# Altium footprint library ICL_komponenty_v1.PcbLib: 160 footprints (part 10 of 10)
Each footprint in its own frame and in the unit in brackets; x right, y up, seen from the top. Pads: shape width x height; smd on the part's side, far side on the other; paste and mask are expansions set on the pad; w line width, h text height; cw(c..) or ccw(c..) is an arc to the next point about the centre after c.
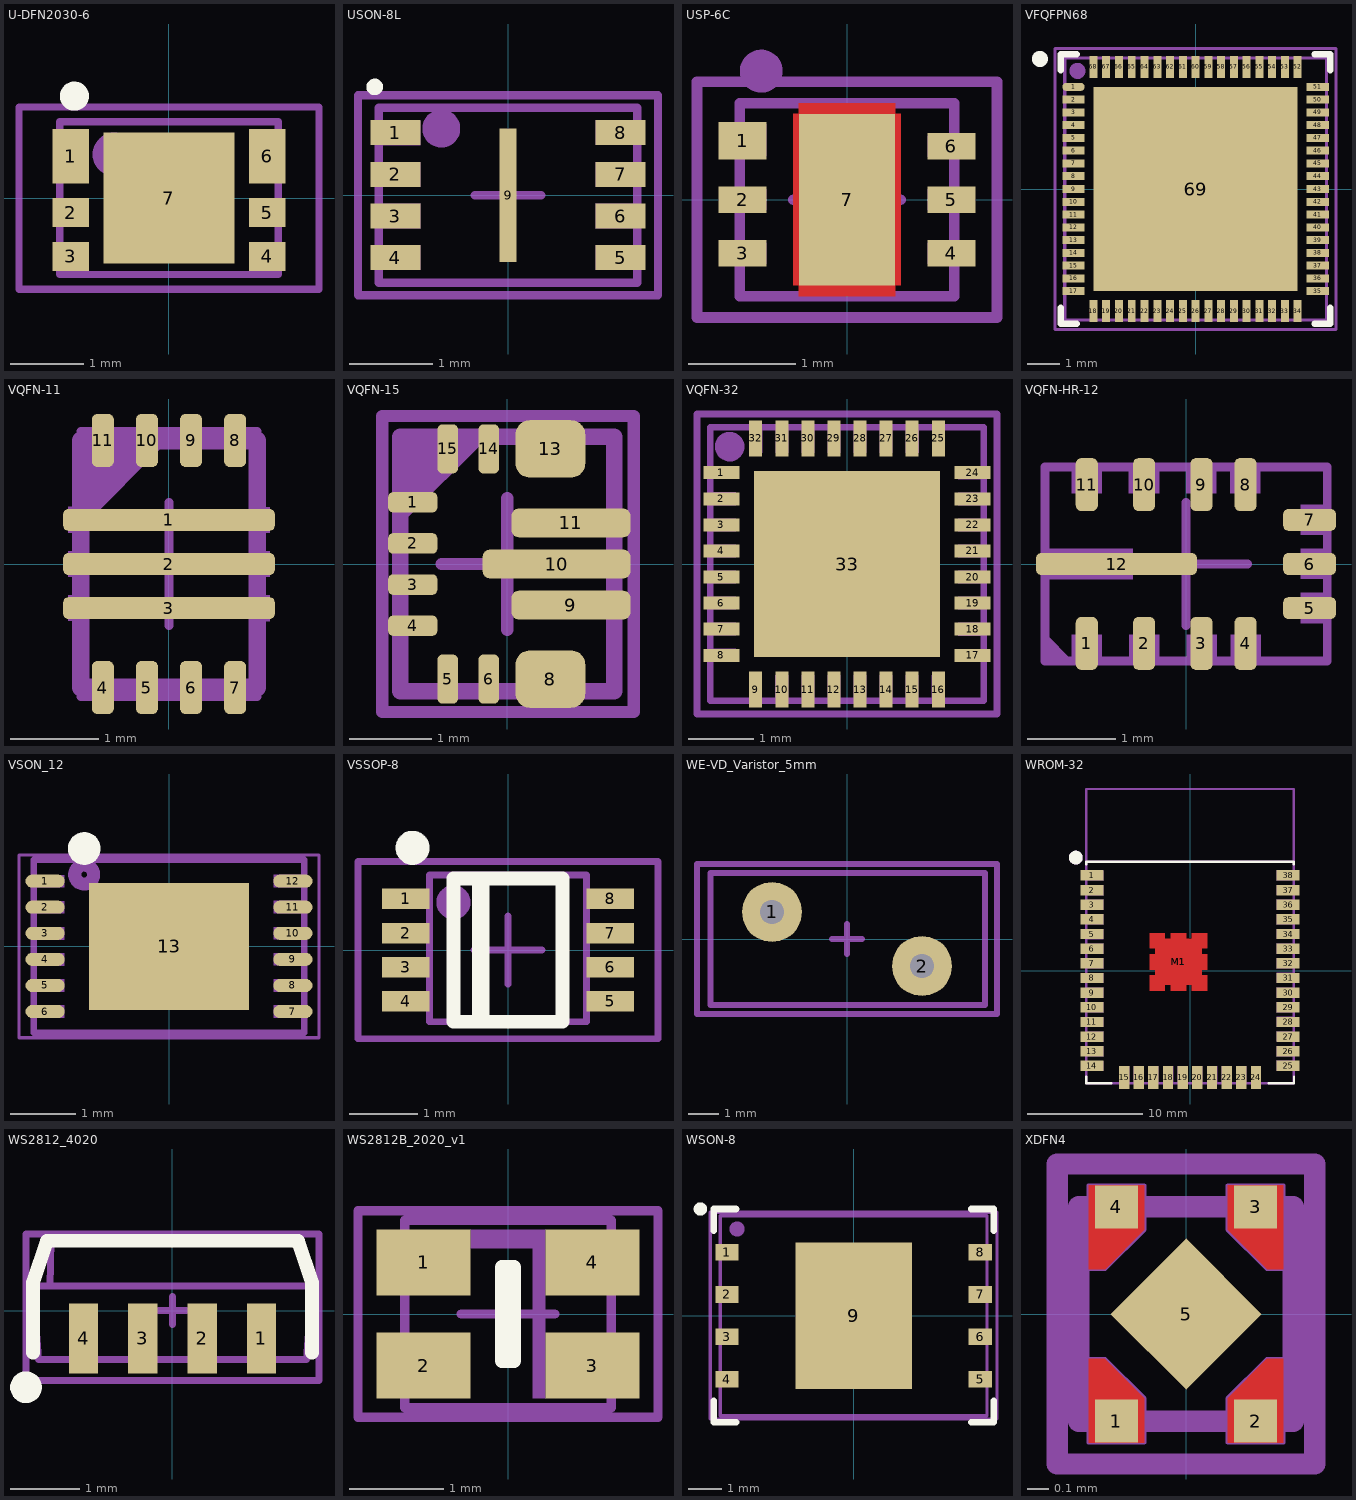
[diagram p9: the footprints below, top view; thin cyan lines are the x and y axes]

## U-DFN2030-6 [mm] "DIODEC modyfied DFN-6"
height 0.6
pads (7):
  rect 0.5x0.75 smd: 1(-1.35,0.575) 6(1.35,0.575)
  rect 0.5x0.4 smd: 2(-1.35,-0.2) 3(-1.35,-0.8) 4(1.35,-0.8) 5(1.35,-0.2)
  rect 1.8x1.8 smd: 7(0,0)
Top Overlay:
  circle w0.2: c-1.3,1.4 r0.1
Top M11-12_SMOT:
  circle w0.3: c-0.75,0.6 r0.15
  rectangle: -1.5,0.25 -1.2,0.9
  rectangle: -1.5,-0.35 -1.2,-0.05
  rectangle: -1.5,-0.95 -1.2,-0.65
  rectangle: 1.2,-0.95 1.5,-0.65
  rectangle: 1.2,-0.35 1.5,-0.05
  rectangle: 1.2,0.25 1.5,0.9
  lines w0.1: -1.5,-1.05 1.5,-1.05 1.5,1.05 -1.5,1.05 -1.5,-1.05
Top M13-14_SDES:
  text "'.Designator'" at 0.2,-3.399 h0.6
Top M15-16_SORG:
  lines w0.1: -0.5,0 0.5,0 ; 0,-0.5 0,0.5 ; -2.06,-1.25 -2.06,1.25 2.06,1.25 2.06,-1.25 -2.06,-1.25
3D body "U-DFN2030-6.step": height 0.6, standoff 0, extent -1.51,-1.075 1.51,1.075

## USON-8L [mm] "3x2mm APMEMORY"
height 0.5
pads (9):
  rect 0.6x0.3 smd paste-0.05: 1(-1.35,0.75) 2(-1.35,0.25) 3(-1.35,-0.25) 4(-1.35,-0.75) 5(1.35,-0.75) 6(1.35,-0.25) 7(1.35,0.25) 8(1.35,0.75)
  rect 0.2x1.6 smd paste-0.1: 9(0,0)
Top Overlay:
  circle w0.1: c-1.6,1.3 r0.05
Top Paste:
  rectangle: -0.1,-0.8 0.1,-0.6
  rectangle: -0.1,-0.4 0.1,-0.1
  rectangle: -0.1,0.1 0.1,0.4
  rectangle: -0.1,0.6 0.1,0.8
Top M11-12_SMOT:
  circle w0.254: c-0.8,0.8 r0.1
  region: 1.55,0.9 1.05,0.9 1.05,0.6 1.55,0.6
  region: 1.55,-0.6 1.05,-0.6 1.05,-0.9 1.55,-0.9
  region: 1.55,0.4 1.05,0.4 1.05,0.1 1.55,0.1
  region: 1.55,-0.1 1.05,-0.1 1.05,-0.4 1.55,-0.4
  rectangle: -1.55,-0.9 -1.05,-0.6
  rectangle: -1.55,0.6 -1.05,0.9
  rectangle: -1.55,-0.4 -1.05,-0.1
  rectangle: -1.55,0.1 -1.05,0.4
  lines w0.1: -1.55,-1.05 -1.55,1.05 1.55,1.05 1.55,-1.05 -1.55,-1.05
Top M13-14_SDES:
  text "'.Designator'" at -2.266,1.333 h0.4
Top M15-16_SORG:
  lines w0.1: -0.4,0 0,0 ; 0,-0.4 0,0 ; 0,0.4 0,0 ; 0.4,0 0,0 ; -1.8,-1.2 -1.8,1.2 1.8,1.2 1.8,-1.2 -1.8,-1.2
3D body "USON-8L.step": height 0.5, standoff 0, extent -1.551,-1.05 1.551,1.05

## USP-6C [mm] "Torex"
pads (7):
  rect 0.45x0.35 smd paste-0.3: 1(-0.975,0.55)
  rect 0.45x0.25 smd paste-0.3: 2(-0.975,0) 3(-0.975,-0.5) 4(0.975,-0.5) 5(0.975,0) 6(0.975,0.5)
  rect 0.9x1.6 smd paste-0.9: 7(0,0)
Top Layer:
  region: -0.5,-0.8 -0.5,0.8 -0.45,0.8 -0.45,0.9 0.45,0.9 0.45,0.8 0.5,0.8 0.5,-0.8 0.45,-0.8 0.45,-0.9 -0.45,-0.9 -0.45,-0.8
Top Paste:
  region: -0.4,0.3 -0.4,0.6 -0.25,0.6 -0.25,0.7 0.25,0.7 0.25,0.6 0.4,0.6 0.4,0.3
  region: -0.4,-0.6 -0.25,-0.6 -0.25,-0.7 0.25,-0.7 0.25,-0.6 0.4,-0.6 0.4,-0.3 -0.4,-0.3
  region: -1.15,0.375 -1.15,0.725 -0.8,0.725 -0.8,0.375
  region: -1.15,-0.125 -1.15,0.125 -0.8,0.125 -0.8,-0.125
  region: -1.15,-0.625 -0.8,-0.625 -0.8,-0.375 -1.15,-0.375
  region: 0.8,0.375 1.15,0.375 1.15,0.625 0.8,0.625
  region: 0.8,-0.125 0.8,0.125 1.15,0.125 1.15,-0.125
  region: 0.8,-0.625 0.8,-0.375 1.15,-0.375 1.15,-0.625
Top M11-12_SMOT:
  circle w0.2: c-0.8,1.2 r0.1
  rectangle: -1,-0.101 -0.75,0.099
  rectangle: -1,-0.601 -0.75,-0.401
  region: 1,-0.399 0.75,-0.399 0.75,-0.599 1,-0.599
  region: 1,0.101 0.75,0.101 0.75,-0.099 1,-0.099
  region: 1,0.601 0.75,0.601 0.75,0.401 1,0.401
  rectangle: -1,0.405 -0.75,0.705
  rectangle: -0.4,-0.7 0.4,0.7
  lines w0.1: -1,-0.9 1,-0.9 1,0.9 -1,0.9 -1,-0.9
Top M13-14_SDES:
  text "'.Designator'" at 0.25,-3.399 h0.6
Top M15-16_SORG:
  lines w0.1: -0.5,0 0,0 ; 0,-0.5 0,0 ; 0,0.5 0,0 ; 0.5,0 0,0 ; -1.4,-1.1 1.4,-1.1 1.4,1.1 -1.4,1.1 -1.4,-1.1
3D body: height 0.61, standoff 0.6, extent -0.9,0.4 -0.5,0.8
3D body: height 0.6, standoff 0, extent -1,-0.9 1,0.9

## VFQFPN68 [mm] "STM QFN 68 E 0.4MM"
height 1
pads (69):
  oval 0.7x0.25 smd: 1(-3.825,3.2)
  rect 0.7x0.25 smd: 2(-3.825,2.8) 3(-3.825,2.4) 4(-3.825,2) 5(-3.825,1.6) 6(-3.825,1.2) 7(-3.825,0.8) 8(-3.825,0.4) 9(-3.825,0) 10(-3.825,-0.4) 11(-3.825,-0.8) 12(-3.825,-1.2) 13(-3.825,-1.6) 14(-3.825,-2) 15(-3.825,-2.4) 16(-3.825,-2.8) 17(-3.825,-3.2) 35(3.825,-3.2) 36(3.825,-2.8) 37(3.825,-2.4) 38(3.825,-2) 39(3.825,-1.6) 40(3.825,-1.2) 41(3.825,-0.8) 42(3.825,-0.4) 43(3.825,0) 44(3.825,0.4) 45(3.825,0.8) 46(3.825,1.2) 47(3.825,1.6) 48(3.825,2) 49(3.825,2.4) 50(3.825,2.8) 51(3.825,3.2)
  rect 0.25x0.7 smd: 18(-3.2,-3.825) 19(-2.8,-3.825) 20(-2.4,-3.825) 21(-2,-3.825) 22(-1.6,-3.825) 23(-1.2,-3.825) 24(-0.8,-3.825) 25(-0.4,-3.825) 26(0,-3.825) 27(0.4,-3.825) 28(0.8,-3.825) 29(1.2,-3.825) 30(1.6,-3.825) 31(2,-3.825) 32(2.4,-3.825) 33(2.8,-3.825) 34(3.2,-3.825) 52(3.2,3.825) 53(2.8,3.825) 54(2.4,3.825) 55(2,3.825) 56(1.6,3.825) 57(1.2,3.825) 58(0.8,3.825) 59(0.4,3.825) 60(0,3.825) 61(-0.4,3.825) 62(-0.8,3.825) 63(-1.2,3.825) 64(-1.6,3.825) 65(-2,3.825) 66(-2.4,3.825) 67(-2.8,3.825) 68(-3.2,3.825)
  rect 6.4x6.4 smd: 69(0,0)
Top Overlay:
  circle w0.25: c-4.875,4.075 r0.125
  lines w0.2: -4.225,-3.725 -4.225,-4.225 -3.725,-4.225 ; -4.225,3.725 -4.225,4.225 -3.725,4.225 ; 3.725,-4.225 4.225,-4.225 4.225,-3.725 ; 3.725,4.225 4.225,4.225 4.225,3.725
Top M11-12_SMOT:
  circle w0.25: c-3.7,3.7 r0.125
  region: -3.3,4.1 -3.3,3.6 -3.1,3.6 -3.1,4.1
  region: -2.9,4.1 -2.9,3.6 -2.7,3.6 -2.7,4.1
  region: -2.5,4.1 -2.5,3.6 -2.3,3.6 -2.3,4.1
  region: -2.1,4.1 -2.1,3.6 -1.9,3.6 -1.9,4.1
  region: -1.7,4.1 -1.7,3.6 -1.5,3.6 -1.5,4.1
  region: -1.3,4.1 -1.3,3.6 -1.1,3.6 -1.1,4.1
  region: -0.9,4.1 -0.9,3.6 -0.7,3.6 -0.7,4.1
  region: -0.5,4.1 -0.5,3.6 -0.3,3.6 -0.3,4.1
  region: -0.1,4.1 -0.1,3.6 0.1,3.6 0.1,4.1
  region: 0.3,4.1 0.3,3.6 0.5,3.6 0.5,4.1
  region: 0.7,4.1 0.7,3.6 0.9,3.6 0.9,4.1
  region: 1.1,4.1 1.1,3.6 1.3,3.6 1.3,4.1
  region: 1.5,4.1 1.5,3.6 1.7,3.6 1.7,4.1
  region: 1.9,4.1 1.9,3.6 2.1,3.6 2.1,4.1
  region: 2.3,4.1 2.3,3.6 2.5,3.6 2.5,4.1
  region: 2.7,4.1 2.7,3.6 2.9,3.6 2.9,4.1
  region: 3.1,4.1 3.1,3.6 3.3,3.6 3.3,4.1
  region: 4.1,3.3 3.6,3.3 3.6,3.1 4.1,3.1
  region: 4.1,2.9 3.6,2.9 3.6,2.7 4.1,2.7
  region: 4.1,2.5 3.6,2.5 3.6,2.3 4.1,2.3
  region: 4.1,2.1 3.6,2.1 3.6,1.9 4.1,1.9
  region: 4.1,1.7 3.6,1.7 3.6,1.5 4.1,1.5
  region: 4.1,1.3 3.6,1.3 3.6,1.1 4.1,1.1
  region: 4.1,0.9 3.6,0.9 3.6,0.7 4.1,0.7
  region: 4.1,0.5 3.6,0.5 3.6,0.3 4.1,0.3
  region: 4.1,0.1 3.6,0.1 3.6,-0.1 4.1,-0.1
  region: 4.1,-0.3 3.6,-0.3 3.6,-0.5 4.1,-0.5
  region: 4.1,-0.7 3.6,-0.7 3.6,-0.9 4.1,-0.9
  region: 4.1,-1.1 3.6,-1.1 3.6,-1.3 4.1,-1.3
  region: 4.1,-1.5 3.6,-1.5 3.6,-1.7 4.1,-1.7
  region: 4.1,-1.9 3.6,-1.9 3.6,-2.1 4.1,-2.1
  region: 4.1,-2.3 3.6,-2.3 3.6,-2.5 4.1,-2.5
  region: 4.1,-2.7 3.6,-2.7 3.6,-2.9 4.1,-2.9
  region: 4.1,-3.1 3.6,-3.1 3.6,-3.3 4.1,-3.3
  region: 3.3,-4.1 3.3,-3.6 3.1,-3.6 3.1,-4.1
  region: 2.9,-4.1 2.9,-3.6 2.7,-3.6 2.7,-4.1
  region: 2.5,-4.1 2.5,-3.6 2.3,-3.6 2.3,-4.1
  region: 2.1,-4.1 2.1,-3.6 1.9,-3.6 1.9,-4.1
  region: 1.7,-4.1 1.7,-3.6 1.5,-3.6 1.5,-4.1
  region: 1.3,-4.1 1.3,-3.6 1.1,-3.6 1.1,-4.1
  region: 0.9,-4.1 0.9,-3.6 0.7,-3.6 0.7,-4.1
  region: 0.5,-4.1 0.5,-3.6 0.3,-3.6 0.3,-4.1
  region: 0.1,-4.1 0.1,-3.6 -0.1,-3.6 -0.1,-4.1
  region: -0.3,-4.1 -0.3,-3.6 -0.5,-3.6 -0.5,-4.1
  region: -0.7,-4.1 -0.7,-3.6 -0.9,-3.6 -0.9,-4.1
  region: -1.1,-4.1 -1.1,-3.6 -1.3,-3.6 -1.3,-4.1
  region: -1.5,-4.1 -1.5,-3.6 -1.7,-3.6 -1.7,-4.1
  region: -1.9,-4.1 -1.9,-3.6 -2.1,-3.6 -2.1,-4.1
  region: -2.3,-4.1 -2.3,-3.6 -2.5,-3.6 -2.5,-4.1
  region: -2.7,-4.1 -2.7,-3.6 -2.9,-3.6 -2.9,-4.1
  region: -3.1,-4.1 -3.1,-3.6 -3.3,-3.6 -3.3,-4.1
  rectangle: -4.1,-3.3 -3.6,-3.1
  rectangle: -4.1,-2.9 -3.6,-2.7
  rectangle: -4.1,-2.5 -3.6,-2.3
  rectangle: -4.1,-2.1 -3.6,-1.9
  rectangle: -4.1,-1.7 -3.6,-1.5
  rectangle: -4.1,-1.3 -3.6,-1.1
  rectangle: -4.1,-0.9 -3.6,-0.7
  rectangle: -4.1,-0.5 -3.6,-0.3
  rectangle: -4.1,-0.1 -3.6,0.1
  rectangle: -4.1,0.3 -3.6,0.5
  rectangle: -4.1,0.7 -3.6,0.9
  rectangle: -4.1,1.1 -3.6,1.3
  rectangle: -4.1,1.5 -3.6,1.7
  rectangle: -4.1,1.9 -3.6,2.1
  rectangle: -4.1,2.3 -3.6,2.5
  rectangle: -4.1,2.7 -3.6,2.9
  rectangle: -4.1,3.1 -3.6,3.3
  lines w0.1: -4.1,-4.1 -4.1,4.1 4.1,4.1 4.1,-4.1 -4.1,-4.1
Top M13-14_SDES:
  text "'.Designator'" at -4.932,4.767 h0.8
Top M15-16_SORG:
  lines w0.1: -1,0 0,0 ; 0,-1 0,0 ; 0,1 0,0 ; 1,0 0,0 ; -4.4,-4.4 -4.4,4.4 4.4,4.4 4.4,-4.4 -4.4,-4.4
3D body "VFQFPN68.step": height 1, standoff 0, extent -4.085,-4.085 4.085,4.085

## VQFN-11 [mm] "3-V to 17-V 4-A Step-Down Converters"
pads (11):
  rrect50% 2.4x0.25 smd paste-0.25 mask+0.05: 1(0,0.5) 2(0,0) 3(0,-0.5)
  rrect50% 0.25x0.6 smd paste+0 mask+0.05: 4(-0.75,-1.4) 5(-0.25,-1.4) 6(0.25,-1.4) 7(0.75,-1.4) 8(0.75,1.4) 9(0.25,1.4) 10(-0.25,1.4) 11(-0.75,1.4)
Top Paste:
  drawing of 9 lines, arcs and shapes, not listed
Top M11-12_SMOT:
  region: 1.052,0.148 1.052,-0.15 1.145,-0.15 1.145,0.148
  region: -1.052,-0.148 -1.052,0.15 -1.145,0.15 -1.145,-0.148
  rectangle: 0.602,1.452 0.9,1.545
  rectangle: 0.102,1.452 0.4,1.545
  region: 1.052,0.648 1.052,0.35 1.145,0.35 1.145,0.648
  region: 0.898,-1.452 0.6,-1.452 0.6,-1.545 0.898,-1.545
  region: 0.398,-1.452 0.1,-1.452 0.1,-1.545 0.398,-1.545
  region: 1.052,-0.352 1.052,-0.65 1.145,-0.65 1.145,-0.352
  rectangle: -0.398,1.452 -0.1,1.545
  rectangle: -0.898,1.452 -0.6,1.545
  region: -1.052,0.352 -1.052,0.65 -1.145,0.65 -1.145,0.352
  region: -0.102,-1.452 -0.4,-1.452 -0.4,-1.545 -0.102,-1.545
  region: -0.602,-1.452 -0.9,-1.452 -0.9,-1.545 -0.602,-1.545
  region: -1.052,-0.648 -1.052,-0.35 -1.145,-0.35 -1.145,-0.648
  region: -1.044,1.428 0.028,1.428 -1.028,0.372 -1.028,0.369
  lines w0.2: -1,-1.4 1,-1.4 1,1.4 -1,1.4 -1,-1.4
Top M13-14_SDES:
  text "'.Designator'" at -0.231,2.818 h0.5
Top M15-16_SORG:
  lines w0.1: -0.7,0 0,0 ; 0,-0.7 0,0 ; 0,0.7 0,0 ; 0.7,0 0,0 ; -1,-1.5 -1,1.5 1,1.5 1,-1.5 -1,-1.5
3D body: height 0.2, standoff 0, extent 1,-0.1 1.014,0.1
3D body: height 0.2, standoff 0, extent -1.014,-0.1 -1,0.1
3D body: height 0.2, standoff 0, extent 0.154,1.496 0.354,1.51
3D body: height 0.2, standoff 0, extent 0.654,1.496 0.854,1.51
3D body: height 0.2, standoff 0, extent 1,0.4 1.014,0.6
3D body: height 0.2, standoff 0, extent 0.146,-1.51 0.346,-1.496
3D body: height 0.2, standoff 0, extent 0.646,-1.51 0.846,-1.496
3D body: height 0.2, standoff 0, extent 1,-0.6 1.014,-0.4
3D body: height 0.2, standoff 0, extent -0.846,1.496 -0.646,1.51
3D body: height 0.2, standoff 0, extent -0.346,1.496 -0.146,1.51
3D body: height 0.2, standoff 0, extent -1.014,0.4 -1,0.6
3D body: height 0.2, standoff 0, extent -0.854,-1.51 -0.654,-1.496
3D body: height 0.2, standoff 0, extent -0.354,-1.51 -0.154,-1.496
3D body: height 0.2, standoff 0, extent -1.014,-0.6 -1,-0.4
3D body: height 1.01, standoff 1, extent -0.842,0.919 -0.443,1.318
3D body: height 1, standoff 0, extent -1,-1.5 1,1.5

## VQFN-15 [mm] "TI VQFN power package"
pads (13):
  rrect50% 0.6x0.25 smd mask+0.05: 1(-1.15,0.75) 2(-1.15,0.25) 3(-1.15,-0.25) 4(-1.15,-0.75)
  rrect50% 0.25x0.6 smd mask+0.05: 5(-0.725,-1.4) 6(-0.225,-1.4) 14(-0.225,1.4) 15(-0.725,1.4)
  rrect50% 0.85x0.7 smd paste-0.45 mask-0.5: 8(0.525,-1.4) 13(0.525,1.4)
  rrect50% 1.45x0.35 smd paste-0.175 mask-0.05: 9(0.775,-0.5) 11(0.775,0.5)
  rrect50% 1.8x0.35 smd paste-0.175 mask-0.05: 10(0.6,0)
Top Paste:
  drawing of 8 lines, arcs and shapes, not listed
Top Solder:
  region: 0.9,-1.235 0.9,-1.6 0.9,-1.62 0.885,-1.657 0.857,-1.685 0.82,-1.7 0.8,-1.7 0.75,-1.7 0.73,-1.7 0.693,-1.685 0.665,-1.657 0.65,-1.62 0.65,-1.6 0.65,-1.35 0.4,-1.35 0.4,-1.6 0.4,-1.62 0.385,-1.657 0.357,-1.685 0.32,-1.7 0.3,-1.7 0.25,-1.7 0.23,-1.7 0.193,-1.685 0.165,-1.657 0.15,-1.62 0.15,-1.6 0.15,-1.25 0.15,-1.22 0.173,-1.165 0.215,-1.123 0.27,-1.1 0.3,-1.1 0.765,-1.1 0.792,-1.1 0.841,-1.121 0.879,-1.159 0.9,-1.208
  region: 0.15,1.25 0.15,1.6 0.15,1.62 0.165,1.657 0.193,1.685 0.23,1.7 0.25,1.7 0.3,1.7 0.32,1.7 0.357,1.685 0.385,1.657 0.4,1.62 0.4,1.6 0.4,1.35 0.65,1.35 0.65,1.6 0.65,1.62 0.665,1.657 0.693,1.685 0.73,1.7 0.75,1.7 0.8,1.7 0.82,1.7 0.857,1.685 0.885,1.657 0.9,1.62 0.9,1.6 0.9,1.25 0.9,1.22 0.877,1.165 0.835,1.123 0.78,1.1 0.75,1.1 0.3,1.1 0.27,1.1 0.215,1.123 0.173,1.165 0.15,1.22
Top M11-12_SMOT:
  region: -1.3,1.55 -0.228,1.55 -1.284,0.494 -1.284,0.491
  lines w0.05: 1.3,-1.55 ccw(c1.3,-1.55) 1.3,-1.55 ; 1.3,-1.55 ccw(c1.3,-1.55) 1.3,-1.55
  lines w0.2: -1.3,-1.55 -1.3,-1.55 ; -1.3,-1.55 -1.3,1.55 1.3,1.55 1.3,-1.55 -1.3,-1.55
Top M13-14_SDES:
  text "'.Designator'" at -5.665,-0.417 h1
Top M15-16_SORG:
  lines w0.15: -0.8,0 0,0 ; 0,-0.8 0,0 ; 0,0.8 0,0 ; 0.8,0 0,0 ; -1.523,-1.8 1.541,-1.8 1.541,1.8 -1.523,1.8 -1.523,-1.8
3D body: height 0.2, standoff 0, extent -0.334,-1.564 -0.116,-1.511
3D body: height 0.2, standoff 0, extent -0.834,-1.564 -0.616,-1.511
3D body: height 0.2, standoff 0, extent -1.314,-0.859 -1.261,-0.641
3D body: height 0.2, standoff 0, extent -1.314,-0.359 -1.261,-0.141
3D body: height 1.05, standoff 1, extent -1.149,0.751 -0.451,1.449
3D body: height 0.2, standoff 0, extent -1.314,0.141 -1.261,0.359
3D body: height 0.2, standoff 0, extent -1.314,0.641 -1.261,0.859
3D body: height 0.2, standoff 0, extent -0.834,1.511 -0.616,1.564
3D body: height 0.2, standoff 0, extent -0.334,1.511 -0.116,1.564
3D body: height 0.2, standoff 0, extent 1.211,-0.636 1.315,-0.361
3D body: height 0.2, standoff 0, extent 0.141,-1.564 0.416,-1.461
3D body: height 0.2, standoff 0, extent 0.641,-1.565 0.916,-1.461
3D body: height 0.2, standoff 0, extent 1.211,0.364 1.315,0.639
3D body: height 0.2, standoff 0, extent 0.634,1.461 0.91,1.564
3D body: height 0.2, standoff 0, extent 0.134,1.461 0.409,1.565
3D body: height 0.2, standoff 0, extent 1.206,-0.135 1.309,0.14
3D body: height 1, standoff 0, extent -1.3,-1.55 1.3,1.55

## VQFN-32 [mm] "TI VQFN 4X4 32 pin"
pads (33):
  rect 0.55x0.2 smd paste+0 mask+0: 1(-1.925,1.4) 2(-1.925,1) 3(-1.925,0.6) 4(-1.925,0.2) 5(-1.925,-0.2) 6(-1.925,-0.6) 7(-1.925,-1) 8(-1.925,-1.4) 17(1.925,-1.4) 18(1.925,-1) 19(1.925,-0.6) 20(1.925,-0.2) 21(1.925,0.2) 22(1.925,0.6) 23(1.925,1) 24(1.925,1.4)
  rect 0.2x0.55 smd paste+0 mask+0: 9(-1.4,-1.925) 10(-1,-1.925) 11(-0.6,-1.925) 12(-0.2,-1.925) 13(0.2,-1.925) 14(0.6,-1.925) 15(1,-1.925) 16(1.4,-1.925) 25(1.4,1.925) 26(1,1.925) 27(0.6,1.925) 28(0.2,1.925) 29(-0.2,1.925) 30(-0.6,1.925) 31(-1,1.925) 32(-1.4,1.925)
  rect 2.85x2.85 smd paste-1.425 mask-1.41: 33(0,0)
Top M11-12_SMOT:
  circle w0.254: c-1.8,1.8 r0.1
  region: -1.7,1.3 -1.7,1.501 -2.1,1.501 -2.1,1.3
  region: -1.7,0.9 -1.7,1.101 -2.1,1.101 -2.1,0.9
  region: -1.7,0.5 -1.7,0.701 -2.1,0.701 -2.1,0.5
  region: -1.7,0.1 -1.7,0.301 -2.1,0.301 -2.1,0.1
  region: -1.7,-0.3 -1.7,-0.099 -2.1,-0.099 -2.1,-0.3
  region: -1.7,-0.7 -1.7,-0.499 -2.1,-0.499 -2.1,-0.7
  region: -1.7,-1.1 -1.7,-0.899 -2.1,-0.899 -2.1,-1.1
  region: -1.7,-1.5 -1.7,-1.299 -2.1,-1.299 -2.1,-1.5
  region: -1.3,-1.7 -1.501,-1.7 -1.501,-2.1 -1.3,-2.1
  region: -0.9,-1.7 -1.101,-1.7 -1.101,-2.1 -0.9,-2.1
  region: -0.5,-1.7 -0.701,-1.7 -0.701,-2.1 -0.5,-2.1
  region: -0.1,-1.7 -0.301,-1.7 -0.301,-2.1 -0.1,-2.1
  region: 0.3,-1.7 0.099,-1.7 0.099,-2.1 0.3,-2.1
  region: 0.7,-1.7 0.499,-1.7 0.499,-2.1 0.7,-2.1
  region: 1.1,-1.7 0.899,-1.7 0.899,-2.1 1.1,-2.1
  region: 1.5,-1.7 1.299,-1.7 1.299,-2.1 1.5,-2.1
  region: 1.7,-1.3 1.7,-1.501 2.1,-1.501 2.1,-1.3
  region: 1.7,-0.9 1.7,-1.101 2.1,-1.101 2.1,-0.9
  region: 1.7,-0.5 1.7,-0.701 2.1,-0.701 2.1,-0.5
  region: 1.7,-0.1 1.7,-0.301 2.1,-0.301 2.1,-0.1
  region: 1.7,0.3 1.7,0.099 2.1,0.099 2.1,0.3
  region: 1.7,0.7 1.7,0.499 2.1,0.499 2.1,0.7
  region: 1.7,1.1 1.7,0.899 2.1,0.899 2.1,1.1
  region: 1.7,1.5 1.7,1.299 2.1,1.299 2.1,1.5
  rectangle: 1.3,1.7 1.501,2.1
  rectangle: 0.9,1.7 1.101,2.1
  rectangle: 0.5,1.7 0.701,2.1
  rectangle: 0.1,1.7 0.301,2.1
  rectangle: -0.3,1.7 -0.099,2.1
  rectangle: -0.7,1.7 -0.499,2.1
  rectangle: -1.1,1.7 -0.899,2.1
  rectangle: -1.5,1.7 -1.299,2.1
  lines w0.1: -2.1,-2.1 -2.1,2.1 2.1,2.1 2.1,-2.1 -2.1,-2.1
Top M13-14_SDES:
  text "'.Designator'" at -5.665,2.783 h1
Top M15-16_SORG:
  lines w0.1: -0.8,0 0,0 ; 0,-0.8 0,0 ; 0,0.8 0,0 ; 0.8,0 0,0 ; -2.3,-2.3 -2.3,2.3 2.3,2.3 2.3,-2.3 -2.3,-2.3
3D body "RSM32_2P8X2P8_TEX.step": height 0.95, standoff 0, extent -2.101,-2.101 2.101,2.101

## VQFN-HR-12 [mm] "TI VQFN-HR-12"
pads (12):
  rrect50% 0.25x0.6 smd paste+0 mask+0.05: 1(-1.125,-0.9) 2(-0.475,-0.9) 3(0.175,-0.9) 4(0.675,-0.9) 8(0.675,0.9) 9(0.175,0.9) 10(-0.475,0.9) 11(-1.125,0.9)
  rrect50% 0.6x0.25 smd paste+0 mask+0.05: 5(1.4,-0.5) 6(1.4,0) 7(1.4,0.5)
  rrect50% 1.825x0.25 smd paste-0.25 mask+0.05: 12(-0.788,0)
Top Paste:
  region: -0.951,-0.125 -1.638,-0.125 -1.65,-0.125 -1.673,-0.115 -1.691,-0.098 -1.7,-0.075 -1.7,-0.062 -1.7,-0.063 -1.7,0.063 -1.7,0.075 -1.691,0.098 -1.673,0.115 -1.65,0.125 -1.638,0.125 -0.951,0.125 -0.939,0.125 -0.916,0.115 -0.898,0.098 -0.888,0.075 -0.888,0.063 -0.888,-0.063 -0.888,-0.075 -0.898,-0.098 -0.916,-0.115 -0.939,-0.125
  region: 0.125,-0.063 0.125,-0.075 0.115,-0.098 0.097,-0.115 0.074,-0.125 0.062,-0.125 -0.625,-0.125 -0.637,-0.125 -0.66,-0.115 -0.678,-0.098 -0.687,-0.075 -0.687,-0.062 -0.687,0.063 -0.687,0.075 -0.678,0.098 -0.66,0.115 -0.637,0.125 -0.625,0.125 0.062,0.125 0.074,0.125 0.097,0.115 0.115,0.098 0.125,0.075 0.125,0.063
Top M11-12_SMOT:
  rectangle: 1.3,-0.172 1.646,0.175
  region: -0.6,0.173 -1.647,0.173 -1.647,-0.174 -0.6,-0.174
  rectangle: 1.3,0.328 1.646,0.675
  region: 0.847,0.8 0.847,1.146 0.5,1.146 0.5,0.8
  region: 0.347,0.8 0.347,1.146 0,1.146 0,0.8
  region: 0.003,-0.8 0.003,-1.146 0.35,-1.146 0.35,-0.8
  region: 0.503,-0.8 0.503,-1.146 0.85,-1.146 0.85,-0.8
  rectangle: 1.3,-0.672 1.646,-0.325
  region: -0.303,0.8 -0.303,1.146 -0.65,1.146 -0.65,0.8
  region: -0.953,0.8 -0.953,1.146 -1.3,1.146 -1.3,0.8
  region: -1.297,-0.8 -1.297,-1.146 -0.95,-1.146 -0.95,-0.8
  region: -0.647,-0.8 -0.647,-1.146 -0.3,-1.146 -0.3,-0.8
  region: -1.6,-1.1 -1.6,-0.781 -1.281,-1.1
  lines w0.1: -1.6,-1.1 1.6,-1.1 1.6,1.1 -1.6,1.1 -1.6,-1.1
Top M13-14_SDES:
  text "'.Designator'" at 0.65,-3.399 h0.6
Top M15-16_SORG:
  lines w0.1: -0.7,0 0,0 ; 0,-0.7 0,0 ; 0,0.7 0,0 ; 0.7,0 0,0 ; -1.6,-1.1 -1.6,1.1 1.6,1.1 1.6,-1.1 -1.6,-1.1
3D body: height 0.3, standoff 0, extent 1.45,-0.125 1.637,0.125
3D body: height 0.3, standoff 0, extent -1.637,-0.125 -1.45,0.125
3D body: height 0.3, standoff 0, extent 0.05,0.95 0.3,1.138
3D body: height 0.3, standoff 0, extent 0.55,0.95 0.8,1.138
3D body: height 0.3, standoff 0, extent 1.45,0.375 1.637,0.625
3D body: height 0.3, standoff 0, extent 1.45,-0.625 1.637,-0.375
3D body: height 0.3, standoff 0, extent 0.55,-1.138 0.8,-0.95
3D body: height 0.3, standoff 0, extent 0.05,-1.138 0.3,-0.95
3D body: height 0.3, standoff 0, extent -1.25,0.95 -1,1.138
3D body: height 0.3, standoff 0, extent -0.6,0.95 -0.35,1.138
3D body: height 0.3, standoff 0, extent -0.6,-1.138 -0.35,-0.95
3D body: height 0.3, standoff 0, extent -1.25,-1.138 -1,-0.95
3D body: height 0.95, standoff 0, extent -1.496,-1 -1.098,-0.6
3D body: height 0.9, standoff 0, extent -1.6,-1.1 1.6,1.1

## VSON_12 [mm] "TI VSON 12 PACKAGE"
height 1
pads (13):
  oval 0.6x0.2 smd: 1(-1.9,1) 2(-1.9,0.6) 3(-1.9,0.2) 4(-1.9,-0.2) 5(-1.9,-0.6) 6(-1.9,-1) 7(1.9,-1) 8(1.9,-0.6) 9(1.9,-0.2) 10(1.9,0.2) 11(1.9,0.6) 12(1.9,1)
  rect 2.45x1.95 smd: 13(0,0)
Top Overlay:
  circle w0.25: c-1.3,1.5 r0.125
Top M11-12_SMOT:
  circle w0.2: c-1.3,1.1 r0.146
  rectangle: 1.6,0.903 2.075,1.1
  rectangle: 1.6,0.503 2.075,0.7
  rectangle: 1.6,0.103 2.075,0.3
  rectangle: 1.6,-0.297 2.075,-0.1
  rectangle: 1.6,-0.697 2.075,-0.5
  rectangle: 1.6,-1.097 2.075,-0.9
  rectangle: -0.9,-0.8 0.9,0.8
  region: -1.6,-0.903 -2.075,-0.903 -2.075,-1.1 -1.6,-1.1
  region: -1.6,-0.503 -2.075,-0.503 -2.075,-0.7 -1.6,-0.7
  region: -1.6,-0.103 -2.075,-0.103 -2.075,-0.3 -1.6,-0.3
  region: -1.6,0.297 -2.075,0.297 -2.075,0.1 -1.6,0.1
  region: -1.6,0.697 -2.075,0.697 -2.075,0.5 -1.6,0.5
  region: -1.6,1.097 -2.075,1.097 -2.075,0.9 -1.6,0.9
  lines w0.1: -2.075,-1.325 2.075,-1.325 2.075,1.325 -2.075,1.325 -2.075,-1.325
Top M13-14_SDES:
  text "'.Designator'" at -3.499,2.05 h0.6
Top M15-16_SORG:
  lines w0.05: -2.3,-1.4 -2.3,1.4 2.3,1.4 2.3,-1.4 -2.3,-1.4
  lines w0.1: -0.5,0 0.5,0 ; 0,-0.5 0,0.5
3D body "VSON_12.step": height 1, standoff 0, extent -2.085,-1.325 2.085,1.325

## VSSOP-8 [mm]
height 0.9
pads (8):
  rect 0.7x0.3 smd: 1(-1.5,0.75) 2(-1.5,0.25) 3(-1.5,-0.25) 4(-1.5,-0.75) 5(1.5,-0.75) 6(1.5,-0.25) 7(1.5,0.25) 8(1.5,0.75)
Top Overlay:
  circle w0.25: c-1.4,1.5 r0.125
  lines w0.2: -0.8,-1.05 0.8,-1.05 0.8,1.05 -0.8,1.05 -0.8,-1.05
  lines w0.254: -0.4,-1 -0.4,1
Top M11-12_SMOT:
  circle w0.25: c-0.8,0.7 r0.125
  rectangle: -1.55,-0.35 -1.15,-0.15
  rectangle: -1.55,-0.85 -1.15,-0.65
  rectangle: -1.55,0.65 -1.15,0.85
  rectangle: -1.55,0.15 -1.15,0.35
  region: 1.55,-0.65 1.15,-0.65 1.15,-0.85 1.55,-0.85
  region: 1.55,-0.15 1.15,-0.15 1.15,-0.35 1.55,-0.35
  region: 1.55,0.35 1.15,0.35 1.15,0.15 1.55,0.15
  region: 1.55,0.85 1.15,0.85 1.15,0.65 1.55,0.65
  lines w0.1: -1.15,-1.05 -1.15,1.1 1.15,1.1 1.15,-1.05 -1.15,-1.05
Top M13-14_SDES:
  text "'.Designator'" at 0.25,-3.399 h0.6
Top M15-16_SORG:
  lines w0.1: -0.5,0 0.5,0 ; 0,-0.5 0,0.5 ; -2.2,-1.3 2.2,-1.3 2.2,1.3 -2.2,1.3 -2.2,-1.3
3D body "VSSOP-8.step": height 0.9, standoff 0, extent -1.549,-1.05 1.549,1.05

## WE-VD_Varistor_5mm [mm] "WE-VD Disk Varistor 5mm"
pads (2):
  round 2 hole 0.8 unplated: 1(-2.5,0.9) 2(2.5,-0.9)
Top M15-16_SORG:
  lines w0.2: -0.5,0 0,0 ; 0,-0.5 0,0 ; 0,0.5 0,0 ; 0.5,0 0,0 ; -5,-2.5 5,-2.5 5,2.5 -5,2.5 -5,-2.5
Top M17-18_TDES:
  text "'.Designator'" at -5.715,2.933 h1
Top M19-20_TMOT:
  lines w0.2: -4.55,-2.2 4.6,-2.2 4.6,2.2 -4.55,2.2 -4.55,-2.2
3D body "WE-VD_5_mm_short.STEP": height 10.75, standoff -1.75, extent -3.75,-1.926 3.746,1.926

## WROM-32 [mm]
pads (40):
  rect 2x0.9 smd: 1(-8.5,8.255) 2(-8.5,6.985) 3(-8.5,5.715) 4(-8.5,4.445) 5(-8.5,3.175) 6(-8.5,1.905) 7(-8.5,0.635) 8(-8.5,-0.635) 9(-8.5,-1.905) 10(-8.5,-3.175) 11(-8.5,-4.445) 12(-8.5,-5.715) 13(-8.5,-6.985) 14(-8.5,-8.255) 25(8.5,-8.255) 26(8.5,-6.985) 27(8.5,-5.715) 28(8.5,-4.445) 29(8.5,-3.175) 30(8.5,-1.905) 31(8.5,-0.635) 32(8.5,0.635) 33(8.5,1.905) 34(8.5,3.175) 35(8.5,4.445) 36(8.5,5.715) 37(8.5,6.985) 38(8.5,8.255)
  rect 0.9x2 smd: 15(-5.715,-9.255) 16(-4.445,-9.255) 17(-3.175,-9.255) 18(-1.905,-9.255) 19(-0.635,-9.255) 20(0.635,-9.255) 21(1.905,-9.255) 22(3.175,-9.255) 23(4.445,-9.255) 24(5.715,-9.255)
  rect 1.33x1.33 on Top Paste mask+0: M1(-1,0.755) M1(-1,0.755)
Top Layer:
  pour cut-out: -2.675,-0.415 -2.675,0.09 -2.17,0.09 -2.17,0.595 -1.665,0.595 -1.665,0.09 -1.16,0.09 -1.16,-0.415 -1.665,-0.415 -1.665,-0.92 -2.17,-0.92 -2.17,-0.415
  pour cut-out: -0.84,-0.415 -0.84,0.09 -0.335,0.09 -0.335,0.595 0.17,0.595 0.17,0.09 0.675,0.09 0.675,-0.415 0.17,-0.415 0.17,-0.92 -0.335,-0.92 -0.335,-0.415
  pour cut-out: -0.84,1.42 -0.335,1.42 -0.335,0.915 0.17,0.915 0.17,1.42 0.675,1.42 0.675,1.925 0.17,1.925 0.17,2.43 -0.335,2.43 -0.335,1.925 -0.84,1.925
  pour cut-out: -2.17,0.915 -2.17,1.42 -2.675,1.42 -2.675,1.925 -2.17,1.925 -2.17,2.43 -1.665,2.43 -1.665,1.925 -1.16,1.925 -1.16,1.42 -1.665,1.42 -1.665,0.915
  region: -3.5,-1.745 -2.17,-1.745 -2.17,-1.24 -1.665,-1.24 -1.665,-1.745 -0.335,-1.745 -0.335,-1.24 0.17,-1.24 0.17,-1.745 1.5,-1.745 1.5,-0.415 0.995,-0.415 0.995,0.09 1.5,0.09 1.5,1.42 0.995,1.42 0.995,1.925 1.5,1.925 1.5,3.255 0.17,3.255 0.17,2.75 -0.335,2.75 -0.335,3.255 -1.665,3.255 -1.665,2.75 -2.17,2.75 -2.17,3.255 -3.5,3.255 -3.5,1.925 -2.995,1.925 -2.995,1.42 -3.5,1.42 -3.5,0.09 -2.995,0.09 -2.995,-0.415 -3.5,-0.415
Top Overlay:
  circle w0.6: c-9.9,9.8 r0.3
  lines w0.2: -9,-9.2 -9,-9.756 -6.8,-9.756 ; -9,9.2 -9,9.448 9,9.448 9,9.2 ; 6.8,-9.754 9.003,-9.754 9.003,-9.198
Top Paste:
  rectangle: 0.17,1.925 1.5,3.255
  rectangle: -1.665,1.925 -0.335,3.255
  rectangle: -3.5,1.925 -2.17,3.255
  rectangle: 0.17,0.09 1.5,1.42
  rectangle: 0.17,-1.745 1.5,-0.415
  rectangle: -1.665,0.09 -0.335,1.42
  rectangle: -1.665,-1.745 -0.335,-0.415
  rectangle: -3.5,0.09 -2.17,1.42
  rectangle: -3.5,-1.745 -2.17,-0.415
Top Solder:
  rectangle: 0.17,-1.745 1.5,-0.415
  rectangle: -1.665,-1.745 -0.335,-0.415
  rectangle: -3.5,-1.745 -2.17,-0.415
  rectangle: -3.5,0.09 -2.17,1.42
  rectangle: -1.665,0.09 -0.335,1.42
  rectangle: 0.17,0.09 1.5,1.42
  rectangle: 0.17,1.925 1.5,3.255
  rectangle: -1.665,1.925 -0.335,3.255
  rectangle: -3.5,1.925 -2.17,3.255
Top M11-12_SMOT:
  circle w0.6: c-9.9,9.8 r0.3
  region: 9,8.71 7.5,8.71 7.5,7.81 9,7.81
  region: 9,2.36 7.5,2.36 7.5,1.46 9,1.46
  region: 9,4.9 7.5,4.9 7.5,4 9,4
  region: 9,6.17 7.5,6.17 7.5,5.27 9,5.27
  region: 9,-7.8 7.5,-7.8 7.5,-8.7 9,-8.7
  region: 9,-5.26 7.5,-5.26 7.5,-6.16 9,-6.16
  region: 9,-3.99 7.5,-3.99 7.5,-4.89 9,-4.89
  region: 9,-1.45 7.5,-1.45 7.5,-2.35 9,-2.35
  rectangle: -9,7.8 -7.5,8.7
  rectangle: -9,5.26 -7.5,6.16
  rectangle: -9,3.99 -7.5,4.89
  rectangle: -9,1.45 -7.5,2.35
  rectangle: -9,-2.36 -7.5,-1.46
  rectangle: -9,-4.9 -7.5,-4
  rectangle: -9,-6.17 -7.5,-5.27
  rectangle: -9,-8.71 -7.5,-7.81
  region: 9,7.44 7.5,7.44 7.5,6.54 9,6.54
  region: 9,3.63 7.5,3.63 7.5,2.73 9,2.73
  region: 9,1.09 7.5,1.09 7.5,0.19 9,0.19
  region: 9,-0.18 7.5,-0.18 7.5,-1.08 9,-1.08
  region: 9,-2.72 7.5,-2.72 7.5,-3.62 9,-3.62
  region: 9,-6.53 7.5,-6.53 7.5,-7.43 9,-7.43
  region: 2.36,-9.755 2.36,-8.255 1.46,-8.255 1.46,-9.755
  region: 4.9,-9.755 4.9,-8.255 4,-8.255 4,-9.755
  region: 6.17,-9.755 6.17,-8.255 5.27,-8.255 5.27,-9.755
  rectangle: -9,6.53 -7.5,7.43
  rectangle: -9,2.72 -7.5,3.62
  rectangle: -9,0.18 -7.5,1.08
  rectangle: -9,-1.09 -7.5,-0.19
  rectangle: -9,-3.63 -7.5,-2.73
  rectangle: -9,-7.44 -7.5,-6.54
  region: -5.26,-9.755 -5.26,-8.255 -6.16,-8.255 -6.16,-9.755
  region: -3.99,-9.755 -3.99,-8.255 -4.89,-8.255 -4.89,-9.755
  region: -1.45,-9.755 -1.45,-8.255 -2.35,-8.255 -2.35,-9.755
  region: 3.63,-9.755 3.63,-8.255 2.73,-8.255 2.73,-9.755
  region: 1.343,3.1 0.309,3.1 0.309,2.1 1.343,2.1
  region: 1.343,1.265 0.309,1.265 0.309,0.265 1.343,0.265
  region: 1.343,-0.57 0.309,-0.57 0.309,-1.57 1.343,-1.57
  region: 1.09,-9.755 1.09,-8.255 0.19,-8.255 0.19,-9.755
  region: -0.492,3.1 -1.526,3.1 -1.526,2.1 -0.492,2.1
  region: -0.492,1.265 -1.526,1.265 -1.526,0.265 -0.492,0.265
  region: -0.492,-0.57 -1.526,-0.57 -1.526,-1.57 -0.492,-1.57
  region: -0.18,-9.755 -0.18,-8.255 -1.08,-8.255 -1.08,-9.755
  region: -2.327,3.1 -3.361,3.1 -3.361,2.1 -2.327,2.1
  region: -2.327,1.265 -3.361,1.265 -3.361,0.265 -2.327,0.265
  region: -2.327,-0.57 -3.361,-0.57 -3.361,-1.57 -2.327,-1.57
  region: -2.72,-9.755 -2.72,-8.255 -3.62,-8.255 -3.62,-9.755
  lines w0.2: -9,-9.763 9,-9.763 9,15.742 -9,15.742 -9,-9.763
Top M13-14_SDES:
  text "'.Designator'" at -5.665,5.883 h1
Top M15-16_SORG:
  lines w0.2: -9,9.445 9,9.445 ; -9,-9.755 -9,15.745 9,15.745 9,-9.755 -9,-9.755
3D body "wrom32_ESP321.step": height 2.92, standoff 0.01, extent -8.95,-9.8 9.05,15.7

## WS2812_4020 [mm] "LED side 2x4mm"
pads (4):
  rect 0.42x1 smd: 1(1.275,-0.4) 2(0.425,-0.4) 3(-0.425,-0.4) 4(-1.275,-0.4)
Top Overlay:
  circle w0.254: c-2.1,-1.1 r0.1
  lines w0.2: -2,-0.6 -2,0.4 -1.8,1 1.8,1 2,0.4 2,-0.6
Top M11-12_SMOT:
  lines w0.1: -1.757,0.35 -1.743,1 ; -2,0.35 -1.922,-0.7 1.922,-0.7 2,0.35 ; -2,0.35 -1.743,1 ; -2,0.35 2,0.35 ; -1.743,1 1.74,1 2,0.35
Top M13-14_SDES:
  text "'.Designator'" at -2.266,0.433 h0.4
Top M15-16_SORG:
  lines w0.1: -0.2,0 0.2,0 ; 0,-0.2 0,0.2 ; -2.1,-1 2.1,-1 2.1,1.1 -2.1,1.1 -2.1,-1
3D body "WS2812-4020.step": height 2.01, standoff 0.01, extent -2,-0.7 2,1.05

## WS2812B_2020_v1 [mm] "2020 WS2812"
height 0.381
pads (4):
  rect 1x0.7 smd: 1(-0.9,0.55) 2(-0.9,-0.55) 3(0.9,-0.55) 4(0.9,0.55)
Top Overlay:
  lines w0.152: -0.064,-0.5 0.064,-0.5 0.064,0.5 -0.064,0.5 -0.064,-0.5
Top M11-12_SMOT:
  rectangle: 0.263,-0.9 0.4,0.9
  rectangle: -1.1,0.3 -0.6,0.8
  rectangle: -1.1,-0.8 -0.6,-0.3
  region: 1.1,0.8 0.6,0.8 0.6,0.3 1.1,0.3
  region: 1.1,-0.3 0.6,-0.3 0.6,-0.8 1.1,-0.8
  rectangle: -0.4,0.7 0.3,0.9
  lines w0.1: -1.1,-1 -1.1,1 1.1,1 1.1,-1 -1.1,-1
Top M13-14_SDES:
  text "'.Designator'" at -2.832,1.392 h0.5
Top M15-16_SORG:
  lines w0.1: -0.5,0 0.5,0 ; 0,-0.5 0,0.5 ; -1.6,-1.1 -1.6,1.1 1.6,1.1 1.6,-1.1 -1.6,-1.1
3D body "WS2812-2020.step": height 0.85, standoff 0.01, extent -1.1,-1 1.1,1

## WSON-8 [mm] "Flash"
height 0.8
pads (9):
  rect 0.7x0.5 smd: 1(-3.8,1.905) 2(-3.8,0.635) 3(-3.8,-0.635) 4(-3.8,-1.905) 5(3.8,-1.905) 6(3.8,-0.635) 7(3.8,0.635) 8(3.8,1.905)
  rect 3.5x4.4 smd paste-1.7: 9(0,0)
Top Overlay:
  circle w0.2: c-4.6,3.2 r0.1
  lines w0.2: -4.2,-2.555 -4.2,-3.2 -3.53,-3.2 ; -4.2,2.555 -4.2,3.2 -3.53,3.2 ; 3.53,-3.2 4.2,-3.2 4.2,-2.555 ; 3.53,3.2 4.2,3.2 4.2,2.555
Top Paste:
  rectangle: -1.595,0.815 -0.665,2.045
  rectangle: -1.595,-0.615 -0.665,0.615
  rectangle: -1.595,-2.045 -0.665,-0.815
  rectangle: -0.465,0.815 0.465,2.045
  rectangle: -0.465,-0.615 0.465,0.615
  rectangle: -0.465,-2.045 0.465,-0.815
  rectangle: 0.665,0.815 1.595,2.045
  rectangle: 0.665,-0.615 1.595,0.615
  rectangle: 0.665,-2.045 1.595,-0.815
Top M11-12_SMOT:
  circle w0.254: c-3.5,2.6 r0.1
  rectangle: 3.5,1.723 4,2.1
  rectangle: 3.5,0.453 4,0.83
  rectangle: 3.5,-0.817 4,-0.44
  rectangle: 3.5,-2.087 4,-1.71
  region: -3.5,2.087 -4,2.087 -4,1.71 -3.5,1.71
  region: -3.5,0.817 -4,0.817 -4,0.44 -3.5,0.44
  region: -3.5,-0.453 -4,-0.453 -4,-0.83 -3.5,-0.83
  region: -3.5,-1.723 -4,-1.723 -4,-2.1 -3.5,-2.1
  lines w0.1: -4,-3 4,-3 4,3 -4,3 -4,-3
Top M13-14_SDES:
  text "'.Designator'" at -3.399,3.45 h0.6
Top M15-16_SORG:
  lines w0.1: -0.5,0 0,0 ; 0,-0.5 0,0 ; 0,0.5 0,0 ; 0.5,0 0,0 ; -4.3,-3.1 4.3,-3.1 4.3,3.1 -4.3,3.1 -4.3,-3.1
3D body "WSON-8.step": height 0.8, standoff 0, extent -4.051,-3.05 4.051,3.05

## XDFN4 [mm] "XDFN4"
pads (5):
  rect 0.2x0.2 smd paste+0 mask+0: 1(-0.325,-0.5) 2(0.325,-0.5) 3(0.325,0.5) 4(-0.325,0.5)
  rect 0.5x0.5 smd rot 45: 5(0,0)
Top Layer:
  region: -0.455,0.21 -0.455,0.6 -0.195,0.6 -0.195,0.393 -0.378,0.21
  region: 0.195,0.393 0.195,0.6 0.455,0.6 0.455,0.21 0.378,0.21
  region: -0.455,-0.6 -0.455,-0.21 -0.378,-0.21 -0.195,-0.393 -0.195,-0.6
  region: 0.195,-0.6 0.455,-0.6 0.455,-0.21 0.378,-0.21 0.195,-0.393
Mechanical 1:
  lines w0.02: -0.455,-0.6 -0.455,-0.21 -0.378,-0.21 -0.195,-0.393 -0.195,-0.6 -0.455,-0.6 ; -0.455,0.21 -0.455,0.6 -0.195,0.6 -0.195,0.393 -0.378,0.21 -0.455,0.21 ; 0.195,-0.6 0.455,-0.6 0.455,-0.21 0.378,-0.21 0.195,-0.393 0.195,-0.6 ; 0.195,0.393 0.195,0.6 0.455,0.6 0.455,0.21 0.378,0.21 0.195,0.393
Top M11-12_SMOT:
  region: -0.5,-0.5 -0.22,-0.5 -0.499,-0.22 -0.5,-0.22
  lines w0.1: -0.5,-0.5 -0.5,0.5 0.5,0.5 0.5,-0.5 -0.5,-0.5
Top M13-14_SDES:
  text "'.Designator'" at -3.399,1.05 h0.6
Top M15-16_SORG:
  lines w0.1: -0.6,-0.7 -0.6,0.7 0.6,0.7 0.6,-0.7 -0.6,-0.7
3D body "XDFN4-711AJ.step": height 0.39, standoff 0.01, extent -0.5,-0.502 0.5,0.502